# Altium footprint library OXI_ONE.PcbLib: 74 footprints (part 3 of 5)
Each footprint in its own frame and in the unit in brackets; x right, y up, seen from the top. Pads: shape width x height; smd on the part's side, far side on the other; paste and mask are expansions set on the pad; w line width, h text height; cw(c..) or ccw(c..) is an arc to the next point about the centre after c.
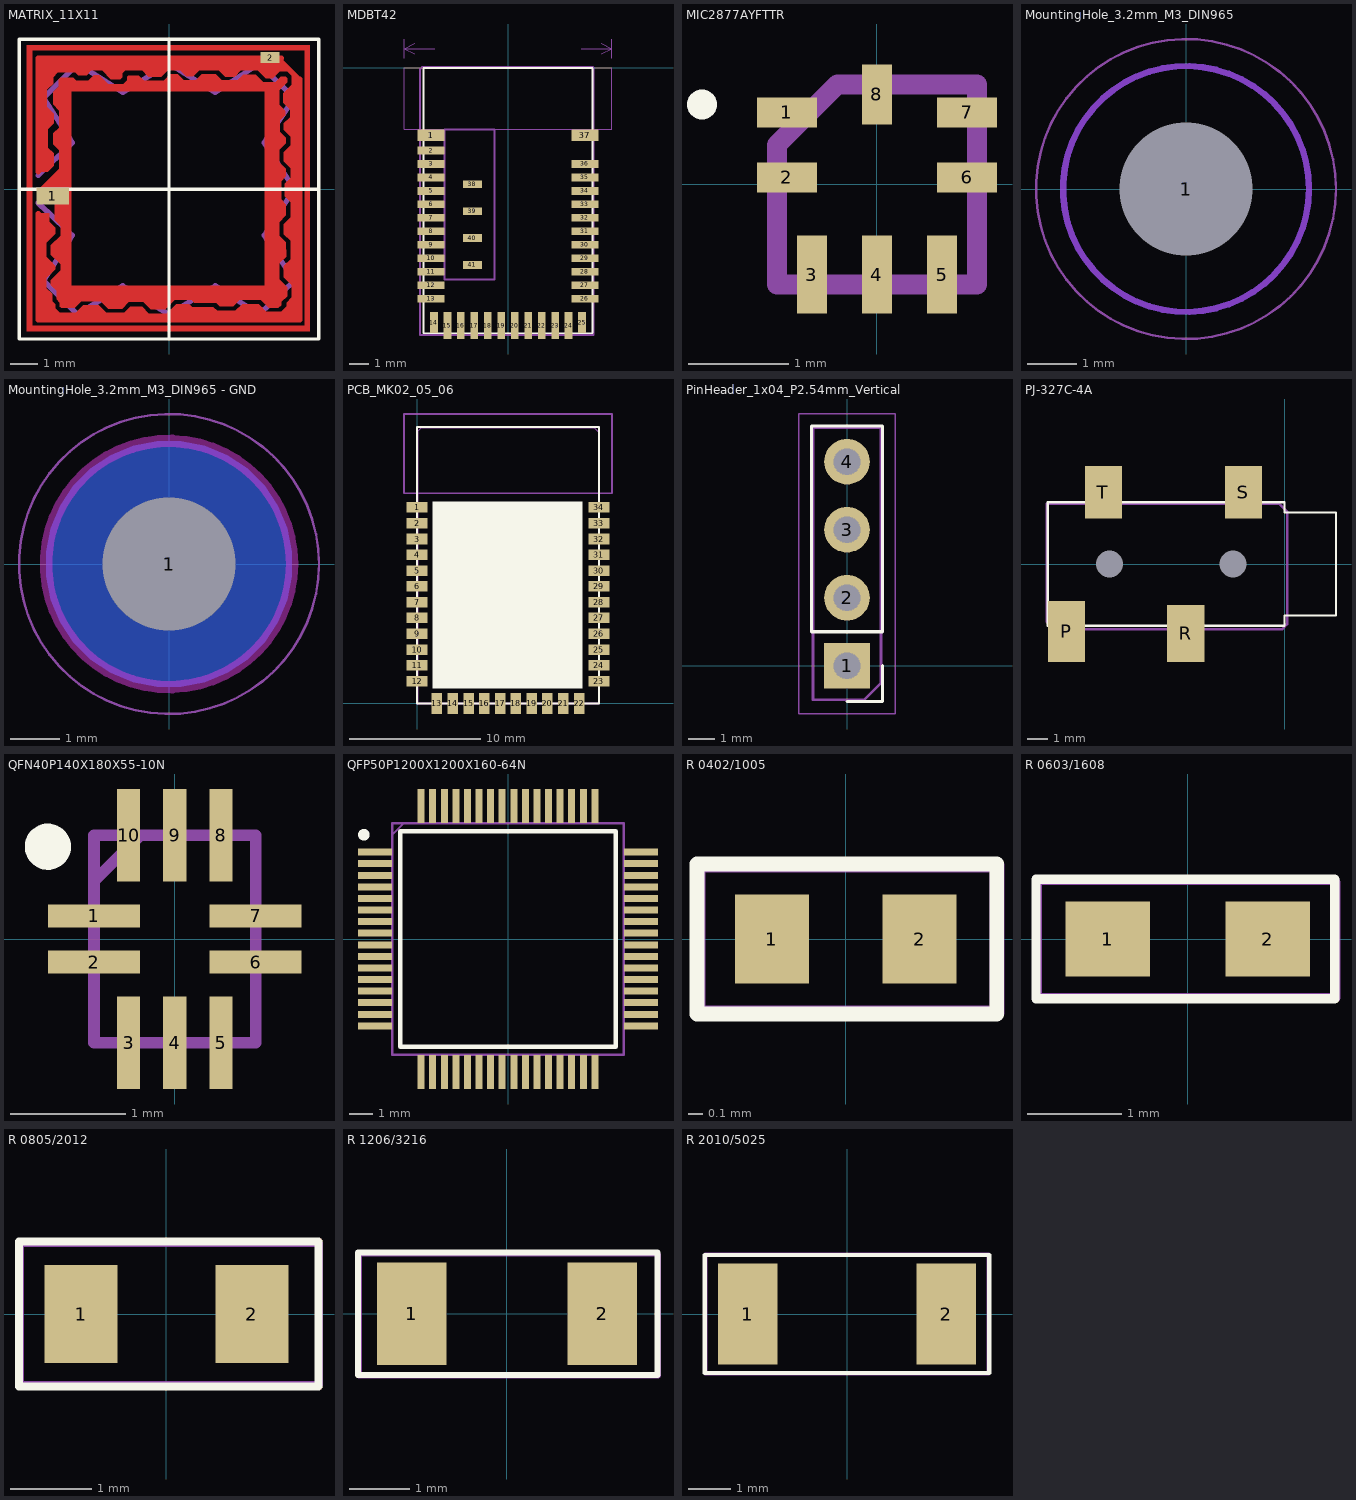
[diagram p2: the footprints below, top view; thin cyan lines are the x and y axes]

## MATRIX_11X11 [mil]
pads (2):
  rect 47.24x25 smd paste-67.72: 1(-168,-10)
  rect 27.56x15.75 smd paste-27.56: 2(146,190)
Top Layer:
  pour cut-out: -205.5,-205 203.5,-205 203.5,-197.5 -205.5,-197.5
  pour cut-out: -205.5,208 -205.5,-205 -197.75,-205 -197.75,208
  pour cut-out: 196,208 196,-205 203.5,-205 203.5,208
  pour cut-out: -205.5,200.75 203.5,200.75 203.5,208 -205.5,208
  region: -37.57,158.07 -36,156.5 -7.5,156.5 2,166 12.5,166 21.5,157 38.5,157 47.5,166 67.5,166 76.5,157 98.5,157 107,165.5 125,165.5 136,154.5 153.5,154.5 161.49,162.49 169,162.5 171,160.5 171,154.5 159.5,143 159.5,122 168,113.5 168,106.5 160,98.5 160,83 169.05,73.96 169.04,66.54 159.48,56.98 159.47,39.02 169.01,29.49 169.01,18.51 162,11.5 162,-14.5 169.03,-21.53 169.04,-37.96 159.5,-47.5 159.5,-67.5 169.05,-77.05 169.05,-97.45 159.5,-107 159.5,-130.49 170.52,-141.52 170.52,-154.48 162.08,-162.92 162.08,-167.42 157.99,-171.51 144,-171.5 132.54,-160.05 102.46,-160.04 93,-169.5 73.5,-169.5 68.5,-164.5 36.5,-164.5 32,-160 8,-160 -5.5,-173.5 -26.5,-173.5 -37.1,-162.9 -57.9,-162.9 -67.5,-172.5 -88,-172.5 -98.51,-162 -127,-162 -136.46,-171.46 -156.05,-171.46 -157.5,-170 -157.5,-164 -162.5,-159 -162.5,-147 -170.5,-139 -170.5,-131.5 -156.5,-117.5 -156.5,-108.5 -170.5,-94.5 -170.51,-81.01 -156.49,-66.99 -156.49,-53.51 -165,-45 -165,5.95 -145,-13.98 -145,-146.5 143,-146.5 143,145 -38.5,145
  region: -147.88,160 -137.5,160 -134,156.5 -116.5,156.5 -108.5,164.5 -101,164.5 -88,151.5 -66,151.5 -60.5,157 -60.5,162.5 -59,164 -43.5,164 -37.5,158 -37.5,145.5 -145,145
  region: -186,2 -158.5,29.5 -158.5,56 -167,64.5 -167,80.5 -158.51,88.99 -158.51,101.49 -155,105 -145,105 -145,2
  region: -188.93,25 -175,25 -166.52,33.48 -166.52,51.52 -175,60 -175,86.5 -166.5,95 -166.5,109 -176.5,119 -176.5,143.5 -167.5,152.5 -167.5,162 -160.5,169 -135.49,169 -131,164.5 -119,164.5 -112.01,171.49 -96.59,171.49 -84.1,159 -70.5,159 -67.5,162 -67.5,167.5 -63.51,171.49 -38.99,171.49 -29.97,162.46 -11.03,162.47 -1.99,171.51 16.49,171.51 25,163 35,163 43.5,171.5 71.99,171.5 81.02,162.48 94.98,162.48 104,171.5 128,171.5 139.5,160 150,160 160,170 171,170 177,164 177,150.5 165,138.5 165,125 175,115 175,104 166,95 166,86 176,76 176,63.5 166,53.5 166,40.5 175.99,30.51 175.99,16.49 167.49,7.99 167.5,-10.5 175.99,-19 175.99,-40.51 166,-50.5 166,-64.92 175.98,-74.9 175.98,-101.02 166,-111 166,-127.51 177.5,-139 177.5,-156.5 170,-164 170,-169 162,-177 140.5,-177 129.47,-165.97 105.53,-165.97 95.49,-176.01 69.51,-176 63.96,-170.46 33.46,-170.46 28.98,-165.98 10.52,-165.98 4.46,-172.04 0,-188.98 188.98,-188.98 190.87,40.5 188.95,162.45 162.46,188.94 -190,190
  region: 5.3,-171.2 -3.5,-180 -29,-180 -39,-170 -56,-170 -64.5,-178.5 -91,-178.5 -101.5,-168 -124,-168 -134.49,-178.49 -158.01,-178.48 -164.49,-172.02 -164.49,-166.52 -168.99,-162 -169.01,-151.5 -177.5,-142.99 -177.5,-128.5 -164.5,-115.5 -164.5,-110.5 -177.49,-97.51 -177.49,-77.49 -164.48,-64.48 -164.48,-55.45 -173,-46.93 -173,-35 -188.54,-35 -188.98,-35.43 -188.98,-188.98 8.98,-188.98 10,-190
  region: -158.5,99.5 -158.5,113.5 -167.5,122.5 -167.5,140.5 -159,149 -159,159 -157,161 -138.5,161 -122.5,145 -145,145 -145,95
  lines w7.87: -188.98,-35.43 -188.98,-170.28 -188.98,-188.98 -170.28,-188.98 170.28,-188.98 188.98,-188.98 188.98,-170.28 188.98,158.5 ; -188.98,25 -188.98,170.28 -188.98,188.98 -170.28,188.98 162.5,188.98 ; -145,-143 -145,145 142,145 142,-143 -145,-143
Top Overlay:
  lines w4.72: -215.75,0 216.54,0 ; 0,-216.14 0,216.93 ; -216.54,-216.54 -216.54,216.54 216.54,216.54 216.54,-216.54 -216.54,-216.54
Mechanical 7:
  lines w7.87: -188.98,-19.68 -139.76,-66.93 -181.1,-131.89 -131.89,-181.1 -66.93,-139.76 0,-181.1 66.93,-139.76 129.92,-181.1 181.1,-131.89 137.8,-66.93 181.1,0 137.8,66.93 181.1,131.89 129.92,181.1 66.93,139.76 0,181.1 -66.93,139.76 -131.89,181.1 -181.1,131.89 -139.76,66.93 -188.98,19.68

## MDBT42 [mm]
pads (41):
  rect 1.4x0.6 smd mask+0: 1(-4,-3.5) 37(4,-3.5)
  rect 1.4x0.4 smd mask+0: 2(-4,-4.3) 3(-4,-5) 4(-4,-5.7) 5(-4,-6.4) 6(-4,-7.1) 7(-4,-7.8) 8(-4,-8.5) 9(-4,-9.2) 10(-4,-9.9) 11(-4,-10.6) 12(-4,-11.3) 13(-4,-12) 26(4,-12) 27(4,-11.3) 28(4,-10.6) 29(4,-9.9) 30(4,-9.2) 31(4,-8.5) 32(4,-7.8) 33(4,-7.1) 34(4,-6.4) 35(4,-5.7) 36(4,-5)
  rect 0.4x1.1 smd mask+0: 14(-3.85,-13.25) 25(3.85,-13.25)
  rect 0.4x1.4 smd mask+0: 15(-3.15,-13.4) 16(-2.45,-13.4) 17(-1.75,-13.4) 18(-1.05,-13.4) 19(-0.35,-13.4) 20(0.35,-13.4) 21(1.05,-13.4) 22(1.75,-13.4) 23(2.45,-13.4) 24(3.15,-13.4)
  rect 1x0.4 smd mask+0: 38(-1.85,-6.05) 39(-1.85,-7.45) 40(-1.85,-8.85) 41(-1.85,-10.25)
Top Overlay:
  lines w0.1: -4.4,-13.8 -4.4,0 0,0 4.4,0 4.4,-13.8 -4.4,-13.8
Mechanical 2:
  lines w0.05: -5.4,0.5 -5.4,1.5 ; -4.861,0.73 -5.4,1 ; -4.861,1.27 -5.4,1 ; -3.8,1 -5.4,1 ; 3.8,1 5.4,1 ; 4.861,0.73 5.4,1 ; 4.861,1.27 5.4,1 ; 5.4,0.5 5.4,1.5 ; -5.4,-3.2 -5.4,0 5.4,0 5.4,-3.2 -5.4,-3.2
  text "as wide as possible" at -3.429,0.762 h0.5
  text "No ground pad" at -2.715,-1.84 h0.45
Top Assembly:
  lines w0.1: -3.3,-11 -3.3,-3.2 -0.7,-3.2 -0.7,-11 -3.3,-11
  text "Toplayer no ground pad" at -2.75,-10.4 h0.3
Top Assembly (Mech29):
  lines w0.1: -4.572,-13.881 4.445,-13.881 4.458,-13.868 4.458,0 4.42,0.038 -4.47,0.038 -4.572,-0.064 -4.572,-13.881
  text ".Designator" at -1.956,-9.042 h1
3D body "User Library-Raytec_MDBT42.step": height 1.8, standoff 0, extent -4.4,-13.703 4.4,0.097

## MIC2877AYFTTR [mm]
pads (8):
  rect 0.6x0.3 smd: 1(-0.9,0.72) 2(-0.9,0.07) 6(0.9,0.07) 7(0.9,0.72)
  rect 0.3x0.78 smd: 3(-0.65,-0.9) 4(0,-0.9) 5(0.65,-0.9)
  rect 0.3x0.6 smd: 8(0,0.9)
Top Overlay:
  lines w0.2: -1.8,0.8 ccw(c-1.75,0.8) -1.7,0.8 ; -1.8,0.8 cw(c-1.75,0.8) -1.7,0.8 ; -1.8,0.8 ccw(c-1.75,0.8) -1.7,0.8
Top Assembly (Mech29):
  lines w0.2: -1,-1 1,-1 1,1 -0.397,1 -1,0.397 -1,-1
  text ".Designator" at -0.889,-0.508 h1
3D body "MIC2877-AYFT-TR.stp": height 0.7, standoff 0, extent -1,-1 1,1

## MountingHole_3.2mm_M3_DIN965 [mm]
pads (1):
  round 2 hole 2.7 paste-3.2 mask+0.051: 1(0,0)
Top Layer keep-out:
  circle w0.127: c0,0 r2.5
Bottom Layer keep-out:
  circle w0.127: c0,0 r2.5
Mechanical 4:
  circle w0.05: c0,0 r3.05
Mechanical 6:
  text "H1" at -0.44,-0.65 h1

## MountingHole_3.2mm_M3_DIN965 - GND [mm]
pads (1):
  round 2 hole 2.7 paste-3.2 mask+0.051: 1(0,0)
Top Layer keep-out:
  circle w0.254: c0,0 r2.502
Bottom Layer:
  region: 0,-2.5 -0.246,-2.5 -0.729,-2.404 -1.184,-2.215 -1.594,-1.942 -1.942,-1.594 -2.215,-1.184 -2.404,-0.729 -2.5,-0.246 -2.5,0 -2.5,0.246 -2.404,0.729 -2.215,1.184 -1.942,1.594 -1.594,1.942 -1.184,2.215 -0.729,2.404 -0.246,2.5 0,2.5 0.246,2.5 0.729,2.404 1.184,2.215 1.594,1.942 1.942,1.594 2.215,1.184 2.404,0.729 2.5,0.246 2.5,0 2.5,-0.246 2.404,-0.729 2.215,-1.184 1.942,-1.594 1.594,-1.942 1.184,-2.215 0.729,-2.404 0.246,-2.5
Mechanical 4:
  circle w0.05: c0,0 r3.05
Mechanical 6:
  text "H1" at -0.44,-0.65 h1

## PCB_MK02_05_06 [mm] "21.0*13.8mm"
height 2
pads (34):
  rect 1.6x0.8 smd: 1(0,14.9) 2(0,13.7) 3(0,12.5) 4(0,11.3) 5(0,10.1) 6(0,8.9) 7(0,7.7) 8(0,6.5) 9(0,5.3) 10(0,4.1) 11(0,2.9) 12(0,1.7) 23(13.8,1.7) 24(13.8,2.9) 25(13.8,4.1) 26(13.8,5.3) 27(13.8,6.5) 28(13.8,7.7) 29(13.8,8.9) 30(13.8,10.1) 31(13.8,11.3) 32(13.8,12.5) 33(13.8,13.7) 34(13.8,14.9)
  rect 0.8x1.6 smd: 13(1.5,0) 14(2.7,0) 15(3.9,0) 16(5.1,0) 17(6.3,0) 18(7.5,0) 19(8.7,0) 20(9.9,0) 21(11.1,0) 22(12.3,0)
Top Overlay:
  rectangle: 1.143,1.143 12.573,15.367
  lines w0.152: 0,0 13.8,0 13.8,21 0,21 0,0
Mechanical 2:
  lines w0.127: -1,15.975 -1,22 14.8,22 14.8,15.975 -1,15.975
  text "No ground pad" at 2.311,18.136 h0.8
Top Assembly (Mech29):
  lines w0.127: 0.025,-0.051 0.025,20.676 0.33,20.98 13.437,20.98 13.818,20.599 13.818,13.792 13.818,0 0.025,0
  text ".Designator" at 4.775,10.185 h1
3D body "Bluetooth module MK02D.stp": height 2.3, standoff 0, extent -0.046,0.013 13.754,21.013

## PCBComponent_1 [mm]

## PinHeader_1x04_P2.54mm_Vertical [mm]
pads (4):
  rect 1.7x1.7 hole 1 paste-1.7 mask+0.051: 1(0,0)
  rrect100% 1.7x1.7 hole 1 paste-1.7 mask+0.051: 2(0,2.54) 3(0,5.08) 4(0,7.62)
Top Overlay:
  lines w0.12: 0,-1.33 1.33,-1.33 1.33,0 ; -1.33,1.27 1.33,1.27 1.33,8.95 -1.33,8.95 -1.33,1.27
Top Assembly:
  lines w0.05: -1.8,-1.8 1.8,-1.8 1.8,9.4 -1.8,9.4 -1.8,-1.8
Bottom Assembly:
  lines w0.1: -1.27,-1.27 -1.27,8.89 1.27,8.89 1.27,-0.635 0.635,-1.27 -1.27,-1.27
  text "SWD_MAIN1" at -1.483,-0.198 h1

## PJ-327C-4A [mm]
pads (6):
  rect 1.8x2.95 smd mask+0.051: P(-10.6,-3.275)
  rect 1.8x2.75 smd mask+0.051: R(-4.8,-3.375)
  rect 1.8x2.55 smd mask+0.051: S(-2,3.475) T(-8.8,3.475)
  round 1 hole 1.3 paste-1 mask+0.051: ""(-8.5,0) ""(-2.5,0)
Top Overlay:
  lines w0.11: -11.5,-3 0,-3 0,-2.5 2.5,-2.5 2.5,2.5 0,2.5 0,3 -11.5,3 -11.5,-3
Top Assembly (Mech29):
  lines w0.127: -11.557,-2.794 -11.176,-3.175 -0.127,-3.175 0.127,-2.921 0.127,2.54 -0.254,2.921 -11.557,2.921 -11.557,-2.794
  text ".Designator" at -6.985,-0.635 h1
3D body "User Library-PJ-327F-5A.step": height 5.1, standoff -0.5, extent -11.505,-4.5 2.495,4.5

## QFN40P140X180X55-10N [mm]
pads (10):
  rect 0.8x0.2 smd: 1(-0.7,0.2) 2(-0.7,-0.2) 6(0.7,-0.2) 7(0.7,0.2)
  rect 0.2x0.8 smd: 3(-0.4,-0.9) 4(0,-0.9) 5(0.4,-0.9) 8(0.4,0.9) 9(0,0.9) 10(-0.4,0.9)
Top Overlay:
  circle w0.2: c-1.1,0.8 r0.1
Top Assembly (Mech29):
  lines w0.1: -0.7,0.5 -0.3,0.9 ; -0.7,-0.9 0.7,-0.9 0.7,0.9 -0.7,0.9 -0.7,-0.9
  text ".Designator" at 0.381,-0.889 h1
3D body "FSUSB42UMX.stp": height 0.55, standoff 0, extent -0.75,-0.95 0.75,0.95

## QFP50P1200X1200X160-64N [mm]
pads (64):
  rect 1.475x0.3 smd: 1(-5.738,3.75) 2(-5.738,3.25) 3(-5.738,2.75) 4(-5.738,2.25) 5(-5.738,1.75) 6(-5.738,1.25) 7(-5.738,0.75) 8(-5.738,0.25) 9(-5.738,-0.25) 10(-5.738,-0.75) 11(-5.738,-1.25) 12(-5.738,-1.75) 13(-5.738,-2.25) 14(-5.738,-2.75) 15(-5.738,-3.25) 16(-5.738,-3.75) 33(5.738,-3.75) 34(5.738,-3.25) 35(5.738,-2.75) 36(5.738,-2.25) 37(5.738,-1.75) 38(5.738,-1.25) 39(5.738,-0.75) 40(5.738,-0.25) 41(5.738,0.25) 42(5.738,0.75) 43(5.738,1.25) 44(5.738,1.75) 45(5.738,2.25) 46(5.738,2.75) 47(5.738,3.25) 48(5.738,3.75)
  rect 0.3x1.475 smd: 17(-3.75,-5.738) 18(-3.25,-5.738) 19(-2.75,-5.738) 20(-2.25,-5.738) 21(-1.75,-5.738) 22(-1.25,-5.738) 23(-0.75,-5.738) 24(-0.25,-5.738) 25(0.25,-5.738) 26(0.75,-5.738) 27(1.25,-5.738) 28(1.75,-5.738) 29(2.25,-5.738) 30(2.75,-5.738) 31(3.25,-5.738) 32(3.75,-5.738) 49(3.75,5.738) 50(3.25,5.738) 51(2.75,5.738) 52(2.25,5.738) 53(1.75,5.738) 54(1.25,5.738) 55(0.75,5.738) 56(0.25,5.738) 57(-0.25,5.738) 58(-0.75,5.738) 59(-1.25,5.738) 60(-1.75,5.738) 61(-2.25,5.738) 62(-2.75,5.738) 63(-3.25,5.738) 64(-3.75,5.738)
Top Overlay:
  circle w0.25: c-6.225,4.5 r0.125
  lines w0.2: -4.65,-4.65 -4.65,4.65 4.65,4.65 4.65,-4.65 -4.65,-4.65
Top Assembly (Mech29):
  lines w0.1: -5,4.5 -4.5,5 ; -5,-5 -5,5 5,5 5,-5 -5,-5
  text ".Designator" at -2.032,-0.508 h1
3D body "STM32F105RBT6TR.stp": height 1.6, standoff 0, extent -6,-6 6,6

## R 0402/1005 [mm]
pads (2):
  rect 0.5x0.6 smd: 1(-0.5,0) 2(0.5,0)
Top Overlay:
  lines w0.1: -1.008,-0.508 -1.008,0.508 1.024,0.508 1.024,-0.508 -1.008,-0.508
Top Assembly (Mech29):
  lines w0.1: -1,-0.5 1.025,-0.5 1.025,0.5 -1,0.5 -1,-0.5
  text ".Designator" at -0.85,-0.3 h0.6
3D body: height 0.64, standoff 0, extent 0.525,-0.3 0.75,0.3
3D body: height 0.64, standoff 0, extent -0.75,-0.3 -0.5,0.3
3D body: height 0.64, standoff 0, extent -0.5,-0.3 0.525,0.3

## R 0603/1608 [mm]
pads (2):
  rect 0.9x0.8 smd: 1(-0.85,0) 2(0.85,0)
Top Overlay:
  lines w0.1: -1.612,-0.635 1.563,-0.635 1.563,0.635 -1.612,0.635 -1.612,-0.635
Top Assembly (Mech29):
  lines w0.1: -1.6,-0.625 1.575,-0.625 1.575,0.6 1.55,0.625 -1.6,0.625 -1.6,-0.625
  text ".Designator" at -1.425,-0.4 h0.8
3D body: height 0.64, standoff 0, extent 0.85,-0.4 1.3,0.4
3D body: height 0.64, standoff 0, extent -1.3,-0.4 -0.85,0.4
3D body: height 0.64, standoff 0, extent -0.85,-0.4 0.85,0.4

## R 0805/2012 [mm]
pads (2):
  rect 0.9x1.2 smd: 1(-1.05,0) 2(1.05,0)
Top Overlay:
  lines w0.1: -1.812,-0.889 -1.812,0.889 1.871,0.889 1.871,-0.889 -1.812,-0.889
Top Assembly (Mech29):
  lines w0.1: -1.8,-0.875 -1.8,0.85 -1.775,0.875 1.875,0.875 1.875,-0.875 -1.8,-0.875
  text ".Designator" at -1.65,-0.55 h1
3D body: height 0.64, standoff 0, extent 1.1,-0.6 1.5,0.6
3D body: height 0.64, standoff 0, extent -1.5,-0.6 -1.05,0.6
3D body: height 0.64, standoff 0, extent -1.05,-0.6 1.1,0.6

## R 1206/3216 [mm]
pads (2):
  rect 1.15x1.7 smd: 1(-1.575,0) 2(1.575,0)
Top Overlay:
  lines w0.1: -2.464,-1.016 2.489,-1.016 2.489,1.016 -2.464,1.016 -2.464,-1.016
Top Assembly (Mech29):
  lines w0.1: -2.45,-1.025 -2.425,-1.025 2.5,-1.025 2.5,0.975 2.475,1 -2.45,1 -2.45,-1.025
  text ".Designator" at -2.225,-0.825 h1
3D body: height 0.64, standoff 0, extent 1.65,-0.85 2.15,0.85
3D body: height 0.64, standoff 0, extent -2.15,-0.85 -1.55,0.85
3D body: height 0.64, standoff 0, extent -1.55,-0.85 1.65,0.85

## R 2010/5025 [mm]
pads (2):
  rect 1.4x2.4 smd: 1(-2.35,0) 2(2.35,0)
Top Overlay:
  lines w0.1: -3.366,-1.397 3.365,-1.397 3.365,1.397 -3.366,1.397 -3.366,-1.397
Top Assembly (Mech29):
  lines w0.1: -3.35,-1.4 3.35,-1.4 3.35,1.4 -3.35,1.4 -3.35,-1.4
  text ".Designator" at -3.1,-1.075 h1
3D body: height 0.64, standoff 0, extent 2.35,-1.2 3.05,1.2
3D body: height 0.64, standoff 0, extent -3.05,-1.2 -2.35,1.2
3D body: height 0.64, standoff 0, extent -2.35,-1.2 2.35,1.2